# Altium footprint library MyComponents_v2.5.PcbLib: 403 footprints (part 5 of 26)
Each footprint in its own frame and in the unit in brackets; x right, y up, seen from the top. Pads: shape width x height; smd on the part's side, far side on the other; paste and mask are expansions set on the pad; w line width, h text height; cw(c..) or ccw(c..) is an arc to the next point about the centre after c.
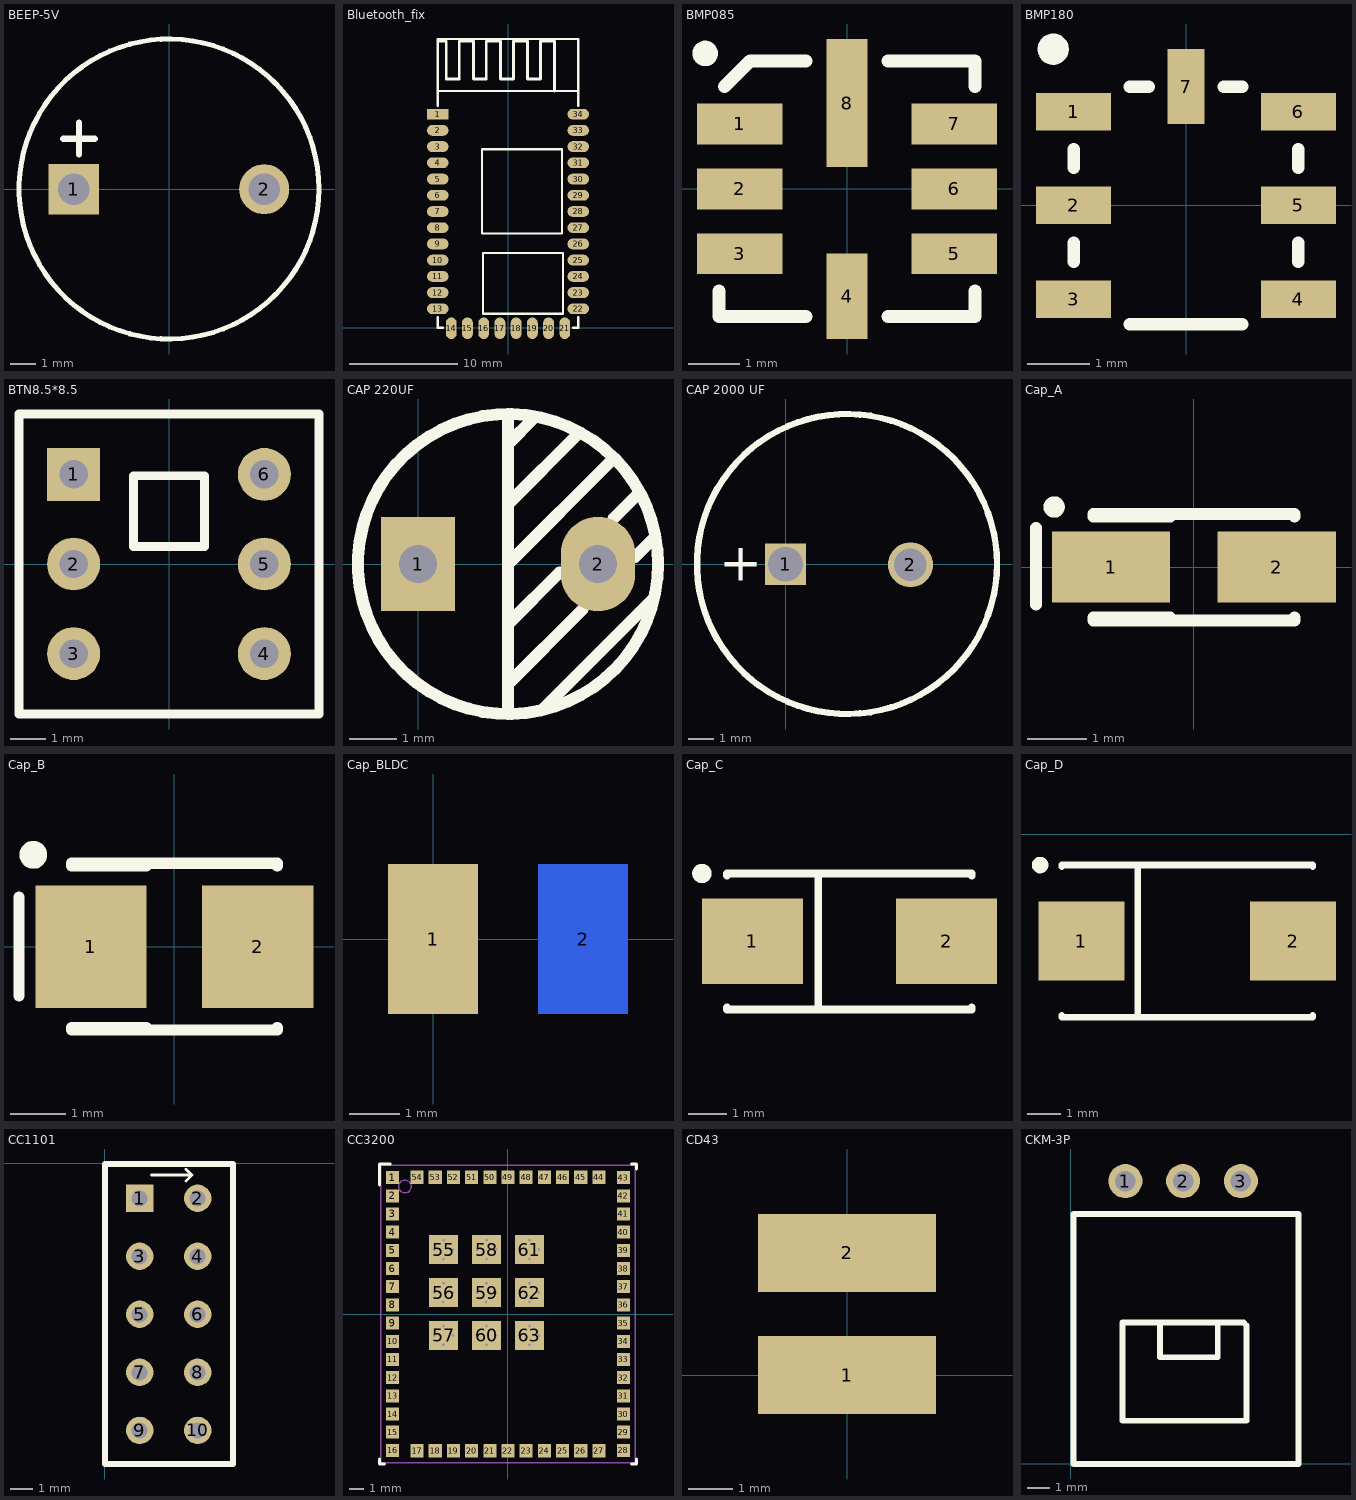
[diagram p4: the footprints below, top view; thin cyan lines are the x and y axes]

## BEEP-5V [mm] "Φ12X9.5mm  5V"
height 9.6
pads (2):
  rect 2.032x2.032 hole 1.27: 1(-3.81,0)
  round 2 hole 1.27: 2(3.81,0)
Top Overlay:
  circle w0.203: c0,0.008 r6
  lines w0.254: -4.235,2.024 -2.965,2.024 ; -3.6,1.389 -3.6,2.659

## Bluetooth_fix [mm]
height 0.6
pads (34):
  rect 2x1 smd: 1(-6.5,19.75)
  oval 2x1 smd: 2(-6.5,18.25) 3(-6.5,16.75) 4(-6.5,15.25) 5(-6.5,13.75) 6(-6.5,12.25) 7(-6.5,10.75) 8(-6.5,9.25) 9(-6.5,7.75) 10(-6.5,6.25) 11(-6.5,4.75) 12(-6.5,3.25) 13(-6.5,1.75) 22(6.5,1.75) 23(6.5,3.25) 24(6.5,4.75) 25(6.5,6.25) 26(6.5,7.75) 27(6.5,9.25) 28(6.5,10.75) 29(6.5,12.25) 30(6.5,13.75) 31(6.5,15.25) 32(6.5,16.75) 33(6.5,18.25) 34(6.5,19.75)
  oval 1x2 smd: 14(-5.248,-0.041) 15(-3.748,-0.041) 16(-2.248,-0.041) 17(-0.748,-0.041) 18(0.752,-0.041) 19(2.252,-0.041) 20(3.752,-0.041) 21(5.252,-0.041)
Top Overlay:
  lines w0.2: -6.5,1 -6.5,0 -6,0 ; -6.5,20.5 -6.5,26.7 6.5,26.7 6.5,20.5 ; -6.5,21.9 6.5,21.9 ; 6,0 6.5,0 6.5,1 ; -2.4,8.7 5,8.7 5,16.5 -2.4,16.5 -2.4,8.7 ; -2.3,1.3 5.1,1.3 5.1,6.9 -2.3,6.9 -2.3,1.3
  lines w0.254: -6.5,26.5 -5.7,26.5 -5.7,23 -4.5,23 -4.5,26.5 -3.2,26.5 -3.2,23 -2,23 -2,26.5 -0.7,26.5 -0.7,23 0.5,23 0.5,26.5 1.8,26.5 1.8,23 3,23 3,26.5 4.3,26.5 4.3,21.9

## BMP085 [mm]
pads (8):
  rect 1.67x0.8 smd: 1(-2.1,1.27) 2(-2.1,0) 3(-2.1,-1.27) 5(2.1,-1.27) 6(2.1,0) 7(2.1,1.27)
  rect 0.8x1.67 smd: 4(0,-2.1)
  rect 0.8x2.5 smd: 8(0,1.68)
Top Overlay:
  circle w0.25: c-2.775,2.65 r0.125
  lines w0.254: -2.5,-2 -2.5,-2.5 -0.8,-2.5 ; -2.4,2 -1.9,2.5 -0.8,2.5 ; 0.8,-2.5 2.5,-2.5 2.5,-2 ; 0.8,2.5 2.5,2.5 2.5,2

## BMP180 [mm]
pads (7):
  rect 1.2x0.6 smd: 1(-1.8,1.5) 2(-1.8,0) 3(-1.8,-1.5) 4(1.8,-1.5) 5(1.8,0) 6(1.8,1.5)
  rect 0.6x1.2 smd: 7(0,1.9)
Top Overlay:
  circle w0.25: c-2.125,2.5 r0.125
  lines w0.2: -1.8,-0.9 -1.8,-0.6 ; -1.8,0.6 -1.8,0.9 ; -0.9,-1.9 0.9,-1.9 ; -0.9,1.9 -0.6,1.9 ; 0.6,1.9 0.9,1.9 ; 1.8,-0.9 1.8,-0.6 ; 1.8,0.6 1.8,0.9

## BTN8.5*8.5 [mm]
pads (6):
  rect 1.5x1.5 hole 0.8: 1(-2.7,2.54)
  round 1.5 hole 0.8: 2(-2.7,0) 3(-2.7,-2.54) 4(2.7,-2.54) 5(2.7,0) 6(2.7,2.54)
Top Overlay:
  lines w0.254: -4.25,-4.25 -4.25,4.25 4.25,4.25 4.25,-4.25 -4.25,-4.25 ; -1,0.5 1,0.5 1,2.5 -1,2.5 -1,0.5

## CAP 220UF [mil]
pads (2):
  rect 62x78.74 hole 32: 1(0,0)
  oval 62x78.74 hole 32: 2(150,0)
Top Overlay:
  circle w10: c75,0 r125
  lines w10: 75,-125 75,125 ; 75,-100 137,-38 ; 75,-50 118,-7 ; 75,0 163,88 ; 75,50 134,109 ; 75,100 97,122 ; 104,-121 196,-29 ; 163,38 184,59 ; 181,6 197,22

## CAP 2000 UF [mm]
pads (2):
  rect 1.651x1.651 hole 1.397: 1(0,0)
  round 1.8 hole 1.3: 2(5,-0.02)
Top Overlay:
  circle w0.254: c2.46,0.01 r6
  text "+" at -2.66,-0.66 h1.5

## Cap_A [mm]
pads (2):
  rect 2x1.2 smd: 1(-1.4,0) 2(1.4,0)
Top Overlay:
  circle w0.18: c-2.361,1.016 r0.09
  lines w0.2: -2.667,-0.635 -2.667,0.665 ; -1.7,-0.9 1.7,-0.9 1.7,-0.85 ; -1.7,-0.85 -0.4,-0.85 ; -1.7,0.85 -0.4,0.85 ; -1.7,0.9 1.7,0.9 1.7,0.85

## Cap_B [mm]
pads (2):
  rect 2x2.2 smd: 1(-1.5,0) 2(1.5,0)
Top Overlay:
  circle w0.25: c-2.538,1.651 r0.125
  lines w0.2: -2.794,-0.889 -2.794,0.889 ; -1.85,-1.5 1.85,-1.5 1.85,-1.45 ; -1.85,-1.45 -0.5,-1.45 ; -1.85,1.45 -0.5,1.45 ; -1.85,1.5 1.85,1.5 1.85,1.45

## Cap_BLDC [mm] "SMT Cap for BLDC POWER"
pads (2):
  rect 1.8x3 smd: 1(0,0)
  rect 1.8x3 smd far side: 2(3,0)

## Cap_C [mm]
pads (2):
  rect 2.6x2.2 smd: 1(-9.333,-6.528) 2(-4.333,-6.528)
Top Overlay:
  circle w0.25: c-10.633,-4.778 r0.125
  lines w0.2: -9.983,-8.228 -9.983,-8.278 -3.683,-8.278 -3.683,-8.228 ; -9.983,-4.828 -9.983,-4.778 -3.683,-4.778 -3.683,-4.828 ; -7.633,-8.278 -7.633,-4.778

## Cap_D [mm]
pads (2):
  rect 2.6x2.4 smd: 1(-12.192,-3.226) 2(-5.792,-3.226)
Top Overlay:
  circle w0.25: c-13.442,-0.926 r0.125
  lines w0.2: -12.792,-5.476 -12.792,-5.526 -5.192,-5.526 -5.192,-5.476 ; -12.792,-0.976 -12.792,-0.926 -5.192,-0.926 -5.192,-0.976 ; -10.492,-5.526 -10.492,-0.926

## CC1101 [mm]
pads (10):
  rect 1.2x1.2 hole 0.7: 1(1.524,-1.524)
  round 1.2 hole 0.7: 2(4.064,-1.524) 3(1.524,-4.064) 4(4.064,-4.064) 5(1.524,-6.604) 6(4.064,-6.604) 7(1.524,-9.144) 8(4.064,-9.144) 9(1.524,-11.684) 10(4.064,-11.684)
Top Overlay:
  lines w0.127: 2.032,-0.508 3.81,-0.508 ; 3.556,-0.254 3.81,-0.508 ; 3.81,-0.508 3.556,-0.762 3.81,-0.508
  lines w0.254: 0,-13.157 5.613,-13.157 5.613,-0.024 0,-0.024 0,-13.157
Bottom Overlay:
  text "GND" at 3.81,-13.208 h0.76
  text "3V3" at 4.064,-0.762 h0.76

## CC3200 [mm]
pads (99):
  rect 0.91x0.91 smd paste-0.05 mask-0.051: 1(-8.05,9.525) 2(-8.05,8.255) 3(-8.05,6.985) 4(-8.05,5.715) 5(-8.05,4.445) 6(-8.05,3.175) 7(-8.05,1.905) 8(-8.05,0.635) 9(-8.05,-0.635) 10(-8.05,-1.905) 11(-8.05,-3.175) 12(-8.05,-4.445) 13(-8.05,-5.715) 14(-8.05,-6.985) 15(-8.05,-8.255) 16(-8.05,-9.525) 17(-6.35,-9.55) 18(-5.08,-9.55) 19(-3.81,-9.55) 20(-2.54,-9.55) 21(-1.27,-9.55) 22(0,-9.55) 23(1.27,-9.55) 24(2.54,-9.55) 25(3.81,-9.55) 26(5.08,-9.55) 27(6.35,-9.55) 28(8.05,-9.525) 29(8.05,-8.255) 30(8.05,-6.985) 31(8.05,-5.715) 32(8.05,-4.445) 33(8.05,-3.175) 34(8.05,-1.905) 35(8.05,-0.635) 36(8.05,0.635) 37(8.05,1.905) 38(8.05,3.175) 39(8.05,4.445) 40(8.05,5.715) 41(8.05,6.985) 42(8.05,8.255) 43(8.05,9.525) 44(6.35,9.55) 45(5.08,9.55) 46(3.81,9.55) 47(2.54,9.55) 48(1.27,9.55) 49(0,9.55) 50(-1.27,9.55) 51(-2.54,9.55) 52(-3.81,9.55) 53(-5.08,9.55) 54(-6.35,9.55)
  rect 2x2 smd paste-0.987 mask-0.991: 55(-4.5,4.5)
  rect 2x2 smd paste-0.987 mask+0: 56(-4.5,1.5) 57(-4.5,-1.5) 58(-1.5,4.5) 59(-1.5,1.5) 60(-1.5,-1.5) 61(1.5,4.5) 62(1.5,1.5) 63(1.5,-1.5)
  round 0.5 / inner round 1.524 / far side round 0.5 hole 0.203 mask+0: 59(-5.15,-1.5) 59(-5.15,1.5) 59(-4.525,0.85) 59(-4.5,-2.15) 59(-4.5,-0.85) 59(-4.5,2.15) 59(-4.5,3.85) 59(-3.85,-1.5) 59(-3.85,1.5) 59(-3.85,4.5) 59(-2.15,-1.5) 59(-2.15,1.5) 59(-2.15,4.5) 59(-1.525,0.85) 59(-1.5,-2.15) 59(-1.5,-0.85) 59(-1.5,2.15) 59(-1.5,3.85) 59(-1.5,5.15) 59(-0.85,-1.5) 59(-0.85,1.5) 59(-0.85,4.5) 59(0.85,-1.5) 59(0.85,1.5) 59(0.85,4.5) 59(1.5,-2.15) 59(1.5,-0.85) 59(1.5,0.85) 59(1.5,2.15) 59(1.5,3.85) 59(1.5,5.15) 59(2.15,-1.5) 59(2.15,1.5) 59(2.15,4.5)
  round 0.5 / inner round 1.524 / far side round 0.5 hole 0.203 mask-0.152: 59(-5.15,4.5) 59(-4.5,5.15)
Top Overlay:
  lines w0.2: -8.975,-10.125 -8.975,-10.475 -8.625,-10.475 ; -8.975,9 -8.975,10.475 -8.225,10.475 ; 8.625,-10.475 8.975,-10.475 8.975,-10.125 ; 8.625,10.475 8.975,10.475 8.975,10.125
Top Paste:
  drawing of 35 lines, arcs and shapes, not listed
Top Solder:
  region: -3.55,3.5 -5.45,3.5 -5.5,3.55 -5.5,4.479 -5.485,4.515 -4.515,5.485 -4.479,5.5 -3.55,5.5 -3.5,5.45 -3.5,3.55
Mechanical 13:
  circle w0.1: c-7.2,8.9 r0.447
  lines w0.1: -8.875,-10.375 -8.875,10.375 8.875,10.375 8.875,-10.375 -8.875,-10.375
3D body "User Library-wi-fi_module_CC3200.STEP": height 1.39, standoff -0.04, extent -8.734,-10.236 8.735,10.227

## CD43 [mm] "CD43 4X4.5X3MM 贴片功率电感"
height 3
pads (2):
  rect 4x1.75 smd: 1(0,0) 2(0,2.75)

## CKM-3P [mm] "台湾CKM带锁排针"
height 0.254
pads (3):
  round 1.5 hole 0.9: 1(2.413,12.446) 2(4.953,12.446) 3(7.493,12.446)
Top Overlay:
  lines w0.254: 3.937,6.223 3.937,4.699 6.477,4.699 6.477,6.223 ; 0.127,0 0.127,11 10.033,11 10.033,0 0.127,0 ; 2.286,1.905 2.286,4.064 2.286,6.223 7.62,6.223 7.747,6.096 7.747,3.937 7.747,1.905 2.286,1.905